# Altium footprint library Electronic Devices_LIB.PcbLib: 410 footprints (part 24 of 26)
Each footprint in its own frame and in the unit in brackets; x right, y up, seen from the top. Pads: shape width x height; smd on the part's side, far side on the other; paste and mask are expansions set on the pad; w line width, h text height; cw(c..) or ccw(c..) is an arc to the next point about the centre after c.
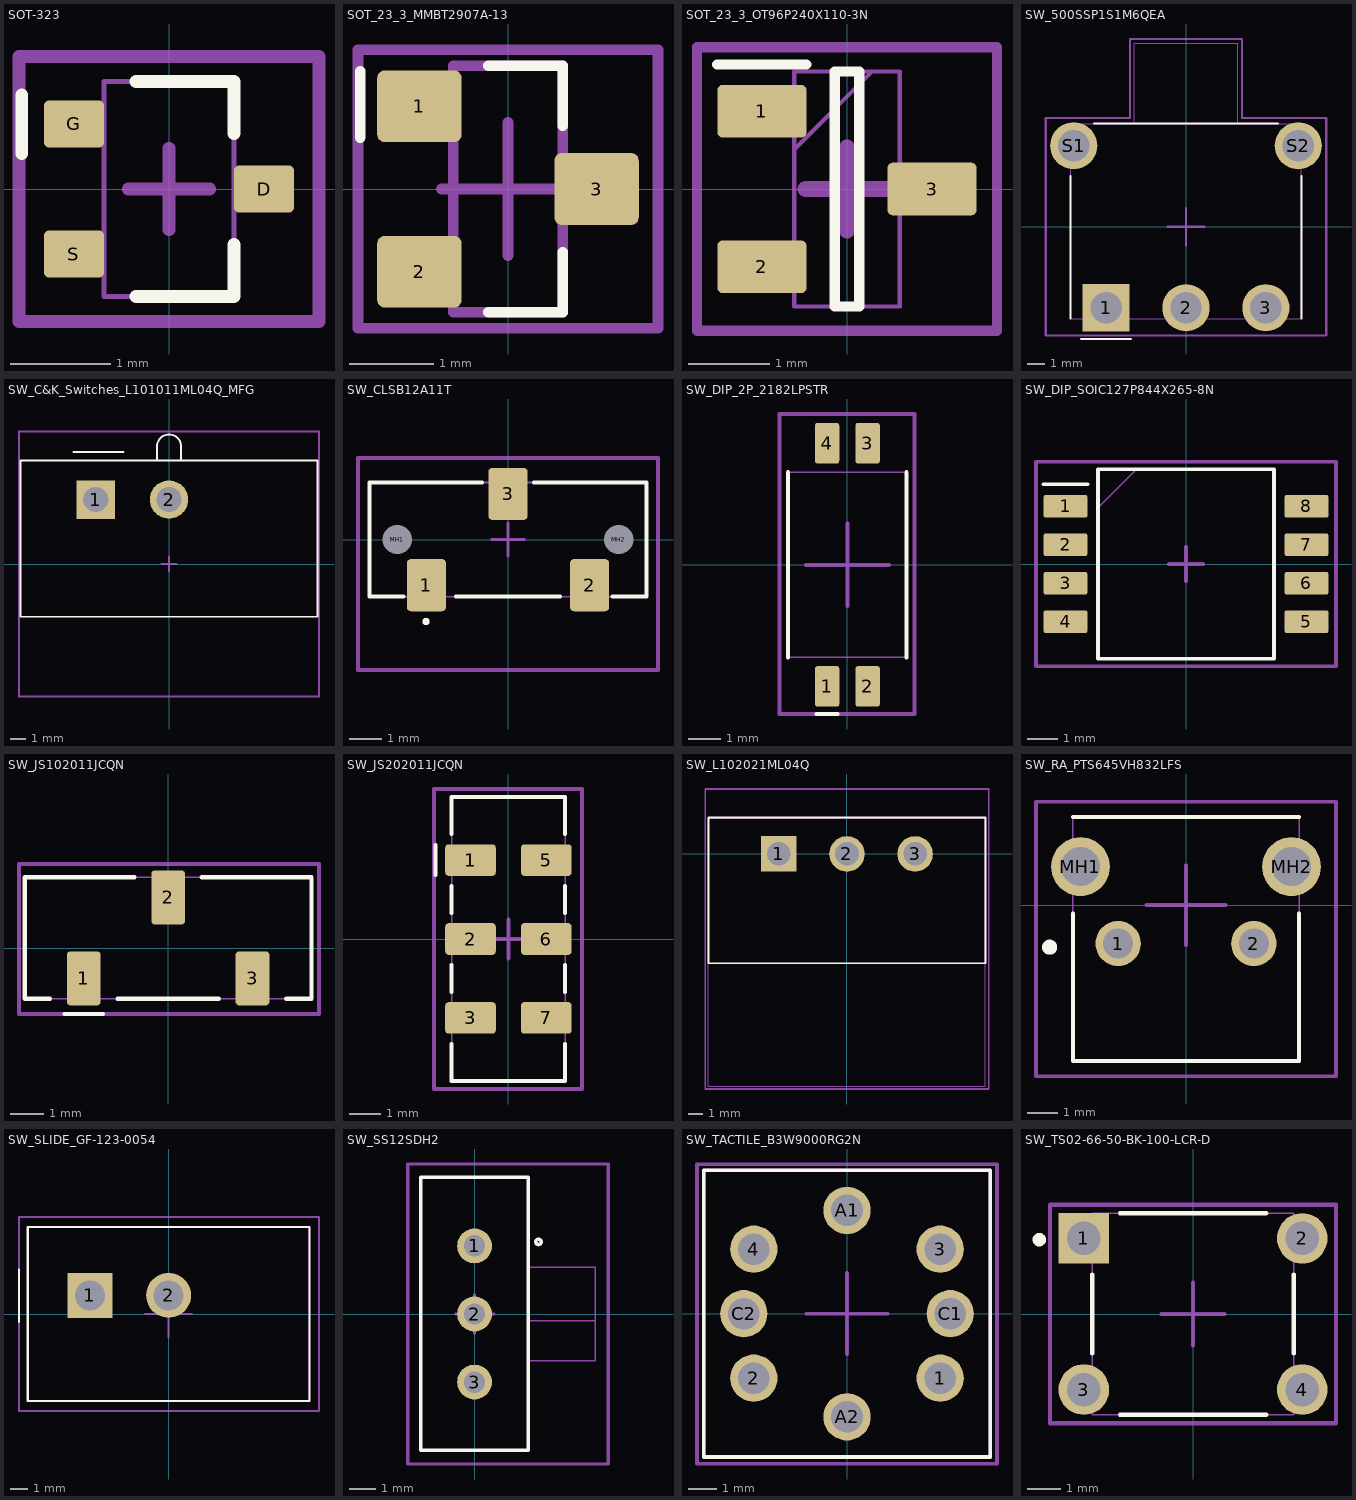
[diagram p23: the footprints below, top view; thin cyan lines are the x and y axes]

## SOT-323 [mm] "SC-70, SOT-323"
height 1.1
pads (3):
  rrect20% 0.6x0.47 smd: D(0.95,0) G(-0.95,0.65) S(-0.95,-0.65)
Top Overlay:
  lines w0.127: -1.473,0.356 -1.473,0.94 ; -0.33,-1.075 0.65,-1.075 0.65,-0.555 ; -0.33,1.075 0.65,1.075 0.65,0.555
Top Assembly:
  lines w0.051: -0.65,-1.075 -0.65,1.075 0.65,1.075 0.65,-1.075 -0.65,-1.075
  text ".Designator" at -2.616,-0.161 h0.51
Top Courtyard:
  lines w0.127: -0.406,0 0,0 ; 0,-0.406 0,0 ; 0,0.406 0,0 ; 0.406,0 0,0 ; -1.5,-1.325 -1.5,1.325 1.5,1.325 1.5,-1.325 -1.5,-1.325
3D body "step_temp.STEP": height 1.1, standoff 0, extent -1.05,-1.075 1.05,1.075

## SOT_23_3_MMBT2907A-13 [mm] "SOT-23-3"
height 1.4
pads (3):
  rrect20% 1x0.85 smd: 1(-1.05,0.98) 2(-1.05,-0.98) 3(1.05,0)
Top Overlay:
  lines w0.127: -1.753,0.61 -1.753,1.397 ; -0.23,-1.46 0.65,-1.46 0.65,-0.75 ; -0.23,1.46 0.65,1.46 0.65,0.75
Top Assembly:
  lines w0.127: -0.65,-1.46 -0.65,1.46 0.65,1.46 0.65,-1.46 -0.65,-1.46
  text ".Designator" at -2.464,-0.237 h0.51
Top Courtyard:
  lines w0.127: -0.787,0 0,0 ; 0,-0.787 0,0 ; 0,0.787 0,0 ; 0.787,0 0,0 ; -1.778,-1.651 1.778,-1.651 1.778,1.651 -1.778,1.651 -1.778,-1.651
3D body "step_temp.STEP": height 1.12, standoff 0, extent -1.21,-1.5 1.21,1.5

## SOT_23_3_OT96P240X110-3N [mm] "SOT 23 3"
height 1.1
pads (3):
  rrect20% 1.1x0.65 smd: 1(-1.05,0.96) 2(-1.05,-0.96) 3(1.05,0)
Top Overlay:
  lines w0.127: -1.6,1.535 -0.5,1.535 ; -0.15,-1.45 -0.15,1.45 0.15,1.45 0.15,-1.45 -0.15,-1.45
Top Assembly:
  lines w0.051: -0.65,0.49 0.31,1.45 ; -0.65,-1.45 0.65,-1.45 0.65,1.45 -0.65,1.45 -0.65,-1.45
  text ".Designator" at -2.464,-0.136 h0.51
Top Courtyard:
  lines w0.127: -1.85,-1.75 -1.85,1.75 1.85,1.75 1.85,-1.75 -1.85,-1.75
  lines w0.203: -0.508,0 0,0 ; 0,-0.508 0,0 ; 0,0.508 0,0 ; 0.508,0 0,0
3D body "2N7002AQ-7.stp": height 1.1, standoff 0, extent -1.2,-1.45 1.2,1.45

## SW_500SSP1S1M6QEA [mm]
height 6.6
pads (5):
  rect 2.775x2.775 / inner round 2.775 / far side rect 2.775x2.775 hole 1.85: 1(-4.7,-4.765)
  round 2.775 hole 1.85: 2(0,-4.765) 3(4.7,-4.765) S1(-6.605,4.765) S2(6.605,4.765)
Top Overlay:
  lines w0.127: -6.785,-5.4 -6.785,2.964 ; -6.172,-6.604 -3.226,-6.604 ; -5.4,6.07 5.4,6.07 ; 6.785,-5.4 6.785,2.964
Top Assembly:
  lines w0.051: -3.05,6.07 -3.05,10.79 3.05,10.79 3.05,6.07 ; -3.05,6.07 3.05,6.07 ; -3.05,6.07 -6.785,6.07 -6.785,-5.4 6.785,-5.4 6.785,6.07 3.05,6.07
  text ".Designator" at -2.134,-0.186 h0.51
Top Courtyard:
  lines w0.127: -1.092,0 0,0 ; 0,-1.092 0,0 ; 0,1.092 0,0 ; 1.092,0 0,0
Mechanical 15:
  lines w0.127: -8.25,-6.405 8.25,-6.405 8.25,6.402 3.3,6.402 3.3,11.04 -3.3,11.04 -3.3,6.402 -8.25,6.402 -8.25,-6.405
3D body "step_temp.STEP": height 6.6, standoff -3.18, extent -6.785,-5.4 6.785,10.79

## SW_C&K_Switches_L101011ML04Q_MFG [mm]
pads (2):
  rect 2.5x2.5 hole 1.65 paste-1000 mask+0: 1(-4.75,4.19)
  round 2.5 hole 1.65 paste-1000 mask+0: 2(0,4.19)
Top Overlay:
  lines w0.127: -6.223,7.29 -2.946,7.29 ; -0.78,6.73 -0.78,7.73 ; -0.77,7.73 cw(c0.005,7.642) 0.78,7.73 0.78,6.73 ; -9.65,-3.43 9.65,-3.43 9.65,6.73 -9.65,6.73 -9.65,-3.43
Top Assembly:
  lines w0.051: -9.75,-8.61 9.75,-8.61 9.75,8.61 -9.75,8.61 -9.75,-8.61
  text ".Designator" at -2.184,1.084 h0.51
Top Courtyard:
  lines w0.127: -0.5,0 0.5,0 ; 0,-0.5 0,0.5 ; -9.75,-8.61 9.75,-8.61 9.75,8.61 -9.75,8.61 -9.75,-8.61
3D body "Switch_C&K_Switches_L101011ML04Q_eec.STEP": height 0.25, standoff 0, extent -9.75,-8.61 9.75,8.61

## SW_CLSB12A11T [mm]
pads (5):
  rrect20% 1.2x1.6 smd: 1(-2.5,-1.4) 2(2.5,-1.4) 3(0,1.4)
  round 0.45 hole 0.9 unplated: MH1(-3.4,0) MH2(3.4,0)
Top Overlay:
  lines w0.127: -3.2,-1.75 -4.25,-1.75 -4.25,1.75 -0.8,1.75 ; -1.6,-1.75 1.6,-1.75 ; 0.8,1.75 4.25,1.75 4.25,-1.75 3.2,-1.75 ; -2.565,-2.515 cw(c-2.515,-2.515) -2.465,-2.515 cw(c-2.515,-2.515) -2.565,-2.515
Top Assembly:
  lines w0.051: -4.25,-1.75 -4.25,1.75 4.25,1.75 4.25,-1.75 -4.25,-1.75
  text ".Designator" at -2.549,-0.28 h0.51
Top Courtyard:
  lines w0.1: -0.5,0 0,0 ; 0,-0.5 0,0 ; 0,0.5 0,0 ; 0.5,0 0,0
  lines w0.127: -4.6,-4 -4.6,2.5 4.6,2.5 4.6,-4 -4.6,-4
3D body "CL-SB-12A-11T.stp": height 3.5, standoff -0.8, extent -4.25,-3.725 4.25,1.775

## SW_DIP_2P_2182LPSTR [mm] "0.050\" (1.27mm), Half"
height 2.65
pads (4):
  rrect20% 0.76x1.27 smd: 1(-0.635,-3.81) 2(0.635,-3.81) 3(0.635,3.81) 4(-0.635,3.81)
Top Overlay:
  lines w0.127: -1.855,-2.9 -1.855,2.9 ; -0.965,-4.674 -0.305,-4.674 ; 1.855,-2.9 1.855,2.9
Top Assembly:
  lines w0.051: -1.855,-2.9 1.855,-2.9 1.855,2.9 -1.855,2.9 -1.855,-2.9
  text ".Designator" at 0.161,-2.362 h0.51
Top Courtyard:
  lines w0.127: -1.295,0 0,0 ; 0,-1.295 0,0 ; 0,1.295 0,0 ; 1.295,0 0,0 ; -2.134,-4.674 2.108,-4.674 2.108,4.724 -2.134,4.724 -2.134,-4.674
3D body "218-2LP.STEP": height 2.5, standoff -0.01, extent -1.856,-4.267 1.854,4.166

## SW_DIP_SOIC127P844X265-8N [mm] "0.050\" (1.27mm), Half"
height 2.65
pads (8):
  rrect20% 1.45x0.75 smd: 1(-3.975,1.905) 2(-3.975,0.635) 3(-3.975,-0.635) 4(-3.975,-1.905) 5(3.975,-1.905) 6(3.975,-0.635) 7(3.975,0.635) 8(3.975,1.905)
Top Overlay:
  lines w0.127: -4.7,2.63 -3.25,2.63 ; -2.9,-3.125 -2.9,3.125 2.9,3.125 2.9,-3.125 -2.9,-3.125
Top Assembly:
  lines w0.051: -2.9,1.855 -1.63,3.125 ; -2.9,-3.125 -2.9,3.125 2.9,3.125 2.9,-3.125 -2.9,-3.125
  text ".Designator" at -2.642,-0.11 h0.51
Top Courtyard:
  lines w0.127: -0.559,0 0,0 ; 0,-0.559 0,0 ; 0,0.559 0,0 ; 0.559,0 0,0 ; -4.95,-3.375 -4.95,3.375 4.95,3.375 4.95,-3.375 -4.95,-3.375
3D body "Switch_CTS_218-4LPST_eec.STEP": height 2.6, standoff 0, extent -4.22,-3.125 4.22,3.125

## SW_JS102011JCQN [mm] "2.00mm"
height 3.6
pads (3):
  rrect20% 1x1.6 smd: 1(-2.5,-0.9) 2(0,1.5) 3(2.5,-0.9)
Top Overlay:
  lines w0.127: -3.5,-1.5 -4.25,-1.5 -4.25,2.1 -1,2.1 ; -3.073,-1.956 -1.93,-1.956 ; -1.5,-1.5 1.5,-1.5 ; 1,2.1 4.25,2.1 4.25,-1.5 3.5,-1.5
Top Assembly:
  lines w0.051: -4.25,-1.5 -4.25,2.1 4.25,2.1 4.25,-1.5 -4.25,-1.5
  text ".Designator" at -2.388,-0.034 h0.51
Top Courtyard:
  lines w0.127: -4.42,-1.956 -4.42,2.489 4.47,2.489 4.47,-1.956 -4.42,-1.956
3D body "JS102011JCQN.stp": height 5.65, standoff 0, extent -4.25,-1.75 4.25,2.35

## SW_JS202011JCQN [mm]
pads (6):
  rrect20% 1.6x1 smd: 1(-1.2,2.5) 2(-1.2,0) 3(-1.2,-2.5) 5(1.2,2.5) 6(1.2,0) 7(1.2,-2.5)
Top Overlay:
  lines w0.127: -2.311,2.032 -2.311,2.972 ; -1.8,-3.32 -1.8,-4.5 1.8,-4.5 1.8,-3.32 ; -1.8,-1.68 -1.8,-0.82 ; -1.8,0.82 -1.8,1.68 ; -1.8,3.32 -1.8,4.5 1.8,4.5 1.8,3.32 ; 1.8,-1.68 1.8,-0.82 ; 1.8,0.82 1.8,1.68
Top Assembly:
  lines w0.051: -1.8,-4.5 1.8,-4.5 1.8,4.5 -1.8,4.5 -1.8,-4.5
  text ".Designator" at -2.515,-0.288 h0.51
Top Courtyard:
  lines w0.127: -0.61,0 0,0 ; 0,-0.61 0,0 ; 0,0.61 0,0 ; 0.61,0 0,0 ; -2.362,-4.75 2.337,-4.75 2.337,4.75 -2.362,4.75 -2.362,-4.75
3D body "JS202011JCQN--3DModel-STEP-1.STEP": height 5.61, standoff 0.01, extent -1.8,-4.5 1.8,4.5

## SW_L102021ML04Q [mm]
height 7.92
pads (3):
  rect 2.475x2.475 / inner round 2.475 / far side rect 2.475x2.475 hole 1.65: 1(-4.75,0)
  round 2.475 hole 1.65: 2(0,0) 3(4.75,0)
Top Overlay:
  lines w0.127: -9.65,-7.62 9.65,-7.62 9.65,2.54 -9.65,2.54 -9.65,-7.62
Top Assembly:
  lines w0.051: -9.65,-16.205 -9.65,2.491 9.65,2.491 9.65,-16.205 -9.65,-16.205
  text ".Designator" at -2.235,-1.025 h0.51
Top Courtyard:
  lines w0.127: -1.219,0 -0.025,0 ; 0,-1.219 0,-0.025 ; 0,0 0,1.194 ; 0.025,0 1.219,0
Mechanical 15:
  lines w0.127: -9.875,-16.383 -9.875,4.521 9.881,4.521 9.881,-16.383 -9.875,-16.383
3D body "step_temp.STEP": height 10.46, standoff -3.96, extent -9.601,-16.091 9.703,4.356

## SW_RA_PTS645VH832LFS [mm]
pads (4):
  round 1.5 hole 1: 1(-2.25,-1.275) 2(2.25,-1.275)
  round 1.95 hole 1.3: MH1(-3.5,1.275) MH2(3.5,1.275)
Top Overlay:
  lines w0.127: -3.75,-0.275 -3.75,-5.175 3.75,-5.175 3.75,-0.275 ; -3.75,2.925 3.75,2.925
  lines w0.3: -4.521,-1.497 ccw(c-4.521,-1.397) -4.521,-1.297 ccw(c-4.521,-1.397) -4.521,-1.497
Top Assembly:
  lines w0.051: -3.75,-5.175 -3.75,2.925 3.75,2.925 3.75,-5.175 -3.75,-5.175
  text ".Designator" at -2.758,-2.477 h0.51
Top Courtyard:
  lines w0.127: -1.321,0 0,0 ; 0,-1.321 0,0 ; 0,1.321 0,0 ; 1.321,0 0,0
Mechanical 15:
  lines w0.127: -4.975,-5.675 -4.975,3.425 4.975,3.425 4.975,-5.675 -4.975,-5.675
3D body "PTS645VH832LFS.stp": height 7.73, standoff -3.62, extent -4.25,-9.505 4.25,2.995

## SW_SLIDE_GF-123-0054 [mm] "3.61mm"
height 17.8
pads (2):
  rect 2.625x2.625 hole 1.75: 1(-4.6,1.09)
  round 2.625 hole 1.75: 2(0,1.09)
Top Overlay:
  lines w0.127: -8.738,-0.457 -8.738,2.591 ; 8.23,1.75 8.23,3.3 ; -8.23,-5.08 -8.23,5.08 8.23,5.08 8.23,-5.08 -8.23,-5.08
Top Assembly:
  lines w0.051: -8.23,-5.08 -8.23,5.08 8.23,5.08 8.23,-5.08 -8.23,-5.08
  text ".Designator" at -2.515,-0.466 h0.51
Top Courtyard:
  lines w0.127: -1.372,0 0,0 ; 0,-1.372 0,0 ; 0,1.372 0,0 ; 1.372,0 0,0 ; -8.738,-5.664 -8.738,5.664 8.788,5.664 8.788,-5.664 -8.738,-5.664
3D body "GF-123-0054--3DModel-STEP-56544.STEP": height 14.96, standoff -4.06, extent -8.255,-5.055 8.204,5.105

## SW_SS12SDH2 [mm]
pads (3):
  round 1.3 hole 0.8: 1(0,2.54) 2(0,0) 3(0,-2.54)
Top Overlay:
  lines w0.127: -2,-5.08 2,-5.08 2,5.1 -2,5.1 -2,-5.08 ; 2.388,2.592 cw(c2.388,2.692) 2.388,2.792 cw(c2.388,2.692) 2.388,2.592
Top Assembly:
  lines w0.051: 2,-0.25 4.5,-0.25 ; 2,-0.25 2,-1.75 4.5,-1.75 4.5,-0.25 ; 2,-0.25 4.5,-0.25 ; 2,-0.25 2,1.75 4.5,1.75 4.5,-0.25 ; -2,-5.1 2,-5.1 2,5.1 -2,5.1 -2,-5.1
  text ".Designator" at -1.93,-0.059 h0.51
Top Courtyard:
  lines w0.127: -0.711,0 0,0 ; 0,-0.711 0,0 ; 0,0.711 0,0 ; 0.711,0 0,0 ; -2.5,-5.6 5,-5.6 5,5.6 -2.5,5.6 -2.5,-5.6
3D body "SS12SDH2.stp": height 5.02, standoff -2.98, extent -1.93,-5.08 4.547,5.131

## SW_TACTILE_B3W9000RG2N [mm]
pads (8):
  round 1.65 hole 1.1: 1(3.25,-2.25) 2(-3.25,-2.25) 3(3.25,2.25) 4(-3.25,2.25) A1(0,3.6) A2(0,-3.6) C1(3.6,0) C2(-3.6,0)
Top Overlay:
  lines w0.127: -5,-5 5,-5 5,5 -5,5 -5,-5
Top Assembly:
  lines w0.127: -5,-5 -5,5 5,5 5,-5 -5,-5
  text ".Designator" at -2.896,-0.186 h0.51
Top Courtyard:
  lines w0.127: -1.422,0 0,0 ; 0,-1.422 0,0 ; 0,1.422 0,0 ; 1.422,0 0,0 ; -5.232,-5.232 -5.232,5.207 5.232,5.207 5.232,-5.232 -5.232,-5.232
3D body "b3w-9000-r1c.stp": height 11.01, standoff -5.49, extent -4.975,-5 5.025,5

## SW_TS02-66-50-BK-100-LCR-D [mm]
pads (4):
  rect 1.508x1.508 / inner round 1.508 / far side rect 1.508x1.508 hole 1: 1(-3.25,2.25)
  round 1.508 hole 1: 2(3.25,2.25) 3(-3.25,-2.25) 4(3.25,-2.25)
Top Overlay:
  circle w0.2: c-4.572,2.21 r0.1
  lines w0.127: -3,-1.176 -3,1.176 ; -2.176,-3 2.176,-3 ; -2.176,3 2.176,3 ; 3,-1.176 3,1.176
Top Assembly:
  lines w0.051: -3,-3 3,-3 3,3 -3,3 -3,-3
  text ".Designator" at -2.54,-0.11 h0.51
Top Courtyard:
  lines w0.127: -0.94,0 0,0 ; 0,-0.94 0,0 ; 0,0.94 0,0 ; 0.94,0 0,0 ; -4.254,-3.254 -4.254,3.254 4.254,3.254 4.254,-3.254 -4.254,-3.254
3D body "CUI_DEVICES_TS02-66-50-BK-100-LCR-D.step": height 5.01, standoff -3.49, extent -3.95,-3 3.95,3